# Altium footprint library myLibraryAltium.PcbLib: 215 footprints (part 13 of 14)
Each footprint in its own frame and in the unit in brackets; x right, y up, seen from the top. Pads: shape width x height; smd on the part's side, far side on the other; paste and mask are expansions set on the pad; w line width, h text height; cw(c..) or ccw(c..) is an arc to the next point about the centre after c.
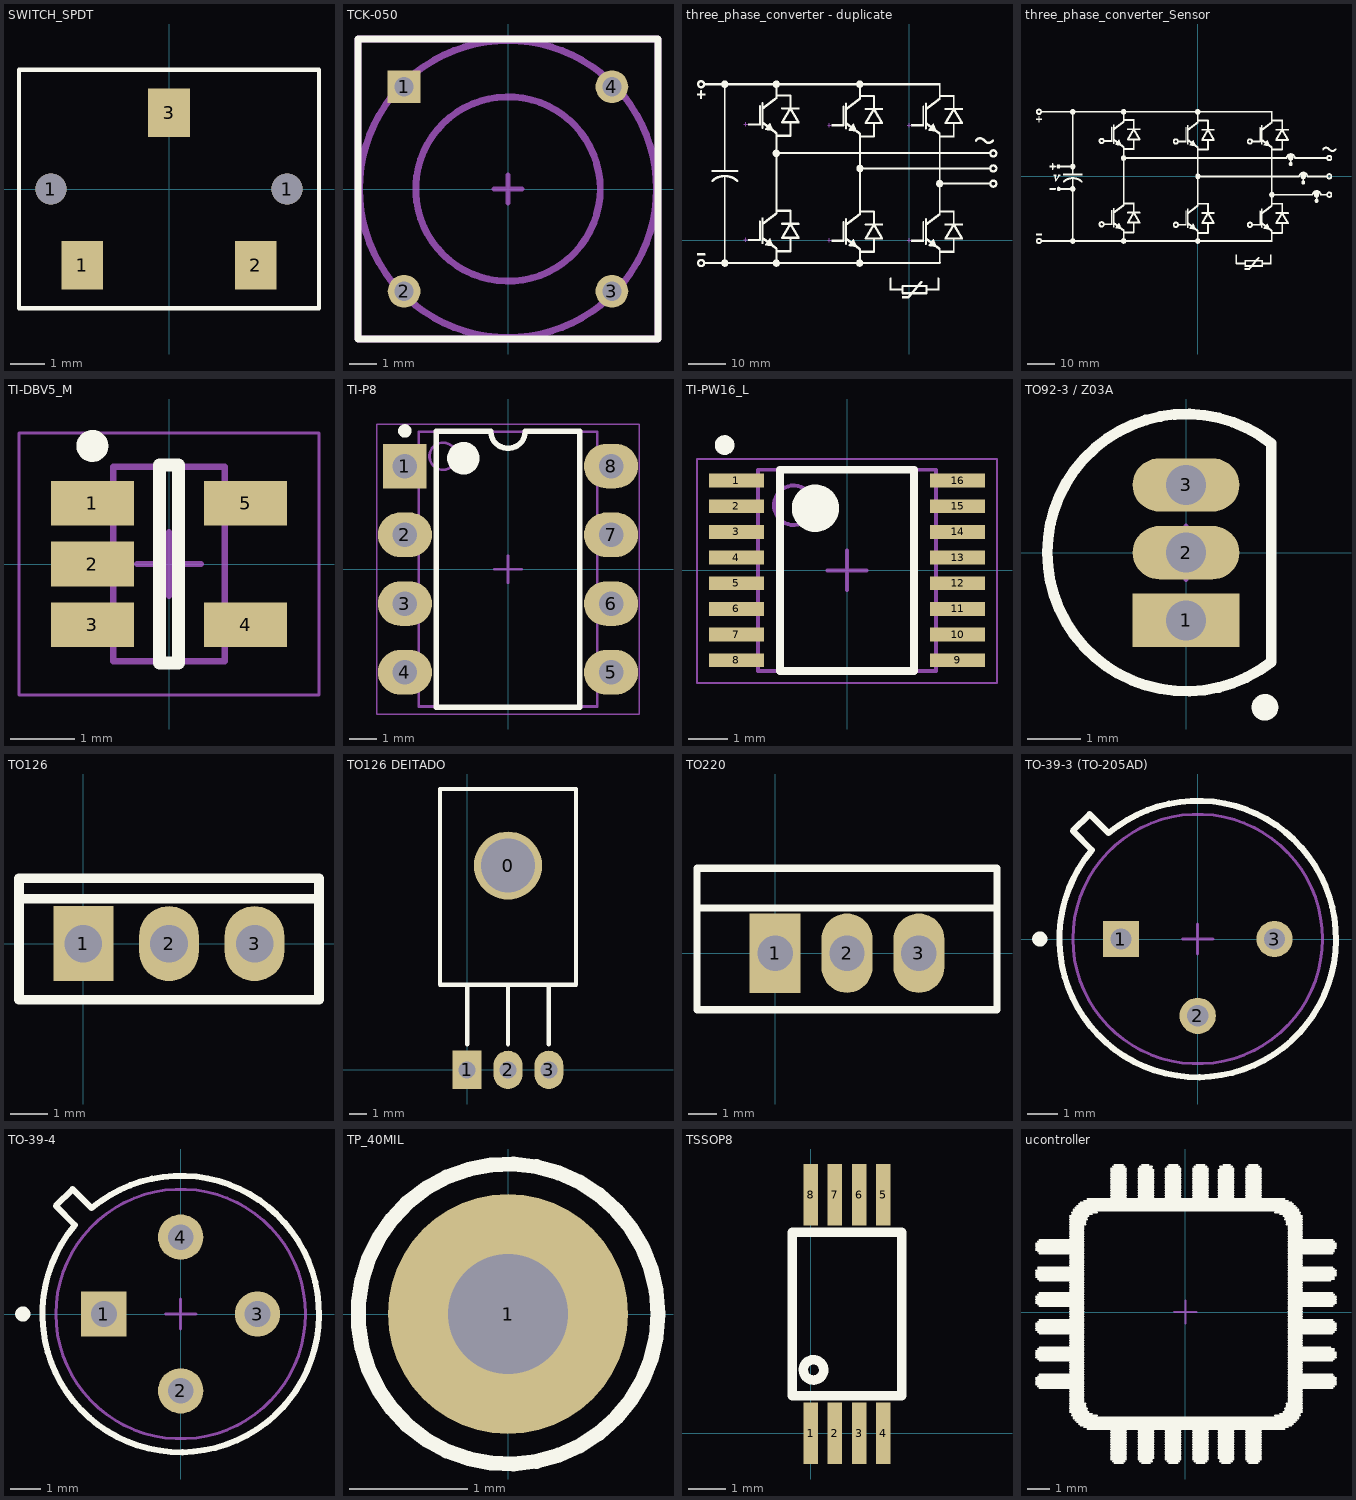
[diagram p12: the footprints below, top view; thin cyan lines are the x and y axes]

## SWITCH_SPDT [mm] "SWITCH SLIDE SPDT 0.2A GULL 12V"
pads (5):
  round 0.9 hole 0.9: 1(-3.4,0) 1(3.4,0)
  rect 1.2x1.4 smd: 1(-2.5,-2.2) 2(2.5,-2.2) 3(0,2.2)
Top Overlay:
  lines w0.127: -4.318,-3.429 4.318,-3.429 4.318,3.429 -4.318,3.429 -4.318,-3.429

## TCK-050 [mm]
pads (4):
  rect 1.2x1.2 hole 0.7: 1(-3.81,3.75)
  round 1.2 hole 0.7: 2(-3.81,-3.75) 3(3.81,-3.75) 4(3.81,3.75)
Top Overlay:
  lines w0.254: -5.5,-5.5 -5.5,5.5 5.5,5.5 5.5,-5.5 -5.5,-5.5
Mechanical 13:
  circle w0.254: c0,0 r3.382
  circle w0.254: c0,0 r5.447
Mechanical 15:
  lines w0.2: -0.5,0 0.5,0 ; 0,-0.5 0,0.5
  lines w0.254: -5.5,-5.5 5.5,-5.5 5.5,5.5 -5.5,5.5 -5.5,-5.5

## three_phase_converter - duplicate [mm] "94x57mm Sem sensores"
Top Overlay:
  drawing of 14004 lines, arcs and shapes, not listed
Mechanical 15:
  lines w0.025: -43.678,0.152 -42.678,0.152 ; -43.653,30.632 -42.653,30.632 ; -43.178,-0.348 -43.178,0.652 ; -43.153,30.132 -43.153,31.132 ; -21.576,0 -20.576,0 ; -21.576,30.429 -20.576,30.429 ; -21.076,-0.5 -21.076,0.5 ; -21.076,29.929 -21.076,30.929 ; -0.5,0 0.5,0 ; -0.5,30.429 0.5,30.429 ; 0,-0.5 0,0.5 ; 0,29.929 0,30.929
  lines w0.2: -13.499,19.05 -12.499,19.05 ; -12.999,18.55 -12.999,19.55

## three_phase_converter_Sensor [mm] "94x57mm Com sensores"
Top Overlay:
  drawing of 15849 lines, arcs and shapes, not listed
Mechanical 15:
  lines w0.2: -0.5,0 0.5,0 ; 0,-0.5 0,0.5

## TI-DBV5_M [mm] "SOT23, 5-Leads, Body 2.9x1.6mm, Pitch 0.95mm, IPC Low Density"
height 1.45
pads (5):
  rect 1.3x0.7 smd mask+0.125: 1(-1.2,0.95) 2(-1.2,0) 3(-1.2,-0.95)
  rect 1.3x0.7 smd: 4(1.2,-0.95) 5(1.2,0.95)
Top Overlay:
  circle w0.25: c-1.2,1.85 r0.125
  lines w0.2: -0.15,-1.55 -0.15,1.55 0.15,1.55 0.15,-1.55 -0.15,-1.55
Mechanical 13:
  lines w0.1: -0.875,-1.525 0.875,-1.525 0.875,1.525 -0.875,1.525 -0.875,-1.525
Mechanical 15:
  lines w0.05: -2.35,-2.05 2.35,-2.05 2.35,2.05 -2.35,2.05 -2.35,-2.05
  lines w0.1: -0.5,0 0.5,0 ; 0,-0.5 0,0.5
3D body: height 1.45, standoff 0, extent -0.875,-1.525 0.875,1.525

## TI-P8 [mm] "DIP, 8-Leads, Body 9.59x6.35mm, Pitch 2.54mm"
height 5.08
pads (8):
  rect 1.6x1.65 hole 0.9: 1(-3.81,3.81)
  oval 2x1.65 hole 0.9: 2(-3.81,1.27) 3(-3.81,-1.27) 4(-3.81,-3.81) 5(3.81,-3.81) 6(3.81,-1.27) 7(3.81,1.27) 8(3.81,3.81)
Top Overlay:
  circle w0.25: c-3.81,5.11 r0.125
  circle w0.6: c-1.65,4.1 r0.3
  lines w0.2: -2.65,-5.1 -2.65,5.1 -0.635,5.1 ccw(c0,5.1) 0.635,5.1 2.65,5.1 2.65,-5.1 -2.65,-5.1
Mechanical 13:
  circle w0.1: c-2.4,4.175 r0.5
  lines w0.1: -3.3,-5.075 -3.3,5.075 3.3,5.075 3.3,-5.075 -3.3,-5.075
Mechanical 15:
  lines w0.05: -4.85,-5.35 -4.85,5.35 4.85,5.35 4.85,-5.35 -4.85,-5.35
  lines w0.1: -0.5,0 0.5,0 ; 0,-0.5 0,0.5
3D body: height 2.66, standoff 0, extent -3.945,3.31 -3.675,4.31
3D body: height 2.93, standoff 2.66, extent -3.945,3.31 -3.3,4.31
3D body: height 0, standoff -1.6, extent -3.945,3.45 -3.675,4.17
3D body: height 2.66, standoff 0, extent -3.945,0.77 -3.675,1.77
3D body: height 2.93, standoff 2.66, extent -3.945,0.77 -3.3,1.77
3D body: height 0, standoff -1.6, extent -3.945,0.91 -3.675,1.63
3D body: height 2.66, standoff 0, extent -3.945,-1.77 -3.675,-0.77
3D body: height 2.93, standoff 2.66, extent -3.945,-1.77 -3.3,-0.77
3D body: height 0, standoff -1.6, extent -3.945,-1.63 -3.675,-0.91
3D body: height 2.66, standoff 0, extent -3.945,-4.31 -3.675,-3.31
3D body: height 2.93, standoff 2.66, extent -3.945,-4.31 -3.3,-3.31
3D body: height 0, standoff -1.6, extent -3.945,-4.17 -3.675,-3.45
3D body: height 2.66, standoff 0, extent 3.675,-4.31 3.945,-3.31
3D body: height 2.93, standoff 2.66, extent 3.3,-4.31 3.945,-3.31
3D body: height 0, standoff -1.6, extent 3.675,-4.17 3.945,-3.45
3D body: height 2.66, standoff 0, extent 3.675,-1.77 3.945,-0.77
3D body: height 2.93, standoff 2.66, extent 3.3,-1.77 3.945,-0.77
3D body: height 0, standoff -1.6, extent 3.675,-1.63 3.945,-0.91
3D body: height 2.66, standoff 0, extent 3.675,0.77 3.945,1.77
3D body: height 2.93, standoff 2.66, extent 3.3,0.77 3.945,1.77
3D body: height 0, standoff -1.6, extent 3.675,0.91 3.945,1.63
3D body: height 2.66, standoff 0, extent 3.675,3.31 3.945,4.31
3D body: height 2.93, standoff 2.66, extent 3.3,3.31 3.945,4.31
3D body: height 0, standoff -1.6, extent 3.675,3.45 3.945,4.17
3D body: height 5.08, standoff 0.51, extent -3.3,-5.075 3.3,5.075

## TI-PW16_L [mm] "SOP, 16-Leads, Body 5x4.4mm, Pitch 0.65mm, IPC High Density"
height 1.2
pads (16):
  rect 1.4x0.35 smd: 1(-2.8,2.275) 2(-2.8,1.625) 3(-2.8,0.975) 4(-2.8,0.325) 5(-2.8,-0.325) 6(-2.8,-0.975) 7(-2.8,-1.625) 8(-2.8,-2.275) 9(2.8,-2.275) 10(2.8,-1.625) 11(2.8,-0.975) 12(2.8,-0.325) 13(2.8,0.325) 14(2.8,0.975) 15(2.8,1.625) 16(2.8,2.275)
Top Overlay:
  circle w0.25: c-3.1,3.175 r0.125
  circle w0.6: c-0.8,1.575 r0.3
  lines w0.2: -1.7,-2.55 -1.7,2.55 1.7,2.55 1.7,-2.55 -1.7,-2.55
Mechanical 13:
  circle w0.1: c-1.35,1.65 r0.5
  lines w0.1: -2.25,-2.55 -2.25,2.55 2.25,2.55 2.25,-2.55 -2.25,-2.55
Mechanical 15:
  lines w0.05: -3.8,-2.85 -3.8,2.825 3.8,2.825 3.8,-2.85 -3.8,-2.85
  lines w0.1: -0.5,0 0.5,0 ; 0,-0.5 0,0.5
3D body: height 1.2, standoff 0.05, extent -2.25,-2.55 2.25,2.55

## TO92-3 / Z03A [mm] "TO, Flat Index; 3 In-Line, Axial Leads; Body Dia. 5mm; Leads 0.55 x 0.50 mm (max)"
height 5.2
pads (3):
  rect 2x1 hole 0.75: 1(0,-1.27)
  oval 2x1 hole 0.75: 2(0,0) 3(0,1.27)
Top Overlay:
  circle w0.25: c1.48,-2.9 r0.125
  lines w0.2: 1.601,-2.049 cw(c0,0) 1.601,2.049 1.6,-2.049
Mechanical 13:
  lines w0.1: 1.601,-2.049 cw(c0,0) 1.601,2.049 1.6,-2.049
Mechanical 15:
  lines w0.1: -0.5,0 0.5,0 ; 0,-0.5 0,0.5
3D body: height 5.2, standoff 0, extent -2.599,-2.611 1.6,2.611

## TO126 [mm]
pads (3):
  rect 1.6x2 hole 1: 1(0,0)
  oval 1.6x2 hole 1: 2(2.28,0) 3(4.56,0)
Top Overlay:
  lines w0.254: -1.72,1.2 6.28,1.2 ; -1.72,-1.5 6.28,-1.5 6.28,1.75 -1.72,1.75 -1.72,-1.5

## TO126 DEITADO [mm]
pads (4):
  round 4 hole 3.17: 0(2.4,12)
  rect 1.7x2.25 hole 1: 1(0,0)
  oval 1.7x2.25 hole 1: 2(2.4,0) 3(4.8,0)
Top Overlay:
  lines w0.254: 0,1.5 0,5 ; 2.4,1.5 2.4,5 ; 4.8,1.5 4.8,5 ; -1.6,5 -1.6,16.5 6.4,16.5 6.4,5 -1.6,5

## TO220 [mm]
pads (3):
  rect 1.8x2.8 hole 1.25: 1(0,0)
  oval 1.8x2.8 hole 1.25: 2(2.54,0) 3(5.08,0)
Top Overlay:
  lines w0.254: -2.76,1.6 7.84,1.6 ; -2.76,-2 -2.76,3 7.84,3 7.84,-2 -2.76,-2

## TO-39-3 (TO-205AD) [mm] "TO, 3-Leads, Diameter 9.145 mm"
height 7.87
pads (3):
  rect 1.2x1.2 hole 0.7: 1(-2.54,0)
  round 1.2 hole 0.7: 2(0,-2.54) 3(2.54,0)
Top Overlay:
  circle w0.25: c-5.223,0 r0.125
  lines w0.2: -4.13,3.575 -3.575,4.13 -2.944,3.499 cw(c0,0) -3.499,2.944 -4.13,3.575
Mechanical 13:
  circle w0.1: c0,0 r4.127
  lines w0.1: -4.13,3.575 -3.499,2.944 ccw(c0,0) -2.944,3.499 -3.575,4.13 -4.13,3.575
Mechanical 15:
  lines w0.1: -0.5,0 0.5,0 ; 0,-0.5 0,0.5
3D body: height 4.54, standoff 1.27, extent -4.577,-4.584 4.574,4.577
3D body: height 7.87, standoff 1.27, extent -4.127,-4.127 4.127,4.127

## TO-39-4 [mm] "TO, 3-Leads, Diameter 9.145 mm"
height 7.87
pads (4):
  rect 1.5x1.5 hole 0.85: 1(-2.54,0)
  round 1.5 hole 0.85: 2(0,-2.54) 3(2.54,0) 4(0,2.54)
Top Overlay:
  circle w0.25: c-5.223,0 r0.125
  lines w0.2: -4.13,3.575 -3.499,2.944 ccw(c0,0) -2.944,3.499 -3.575,4.13 -4.13,3.575
Mechanical 13:
  circle w0.1: c0,0 r4.127
  lines w0.1: -4.13,3.575 -3.575,4.13 -2.944,3.499 cw(c0,0) -3.499,2.944 -4.13,3.575
Mechanical 15:
  lines w0.1: -0.5,0 0.5,0 ; 0,-0.5 0,0.5
3D body: height 7.87, standoff 1.27, extent -4.127,-4.127 4.127,4.127
3D body: height 4.54, standoff 1.27, extent -4.577,-4.584 4.574,4.577

## TP_40MIL [mil] "Test Point 60 mil dia."
pads (1):
  round 80 hole 40: 1(0,0)
Top Overlay:
  circle w5: c0,0 r50

## TSSOP8 [mm]
pads (8):
  rect 0.39x1.651 smd: 1(0,0) 2(0.65,0) 3(1.3,0) 4(1.95,0) 5(1.95,6.4) 6(1.3,6.4) 7(0.65,6.4) 8(0,6.4)
Top Overlay:
  lines w0.254: 0.349,1.723 ccw(c0.076,1.7) 0.35,1.7 ; -0.5,1 2.45,1 2.45,5.4 -0.5,5.4 -0.5,1

## ucontroller [mm] "Micro Logotipo 15x15mm"
Top Overlay:
  drawing of 496 lines, arcs and shapes, not listed
Mechanical 15:
  lines w0.1: -0.5,0 0.5,0 ; 0,-0.5 0,0.5